# Altium footprint library ref-packages-longpad.PCBLIB: 1527 footprints (part 72 of 103)
Each footprint in its own frame and in the unit in brackets; x right, y up, seen from the top. Pads: shape width x height; smd on the part's side, far side on the other; paste and mask are expansions set on the pad; w line width, h text height; cw(c..) or ccw(c..) is an arc to the next point about the centre after c.
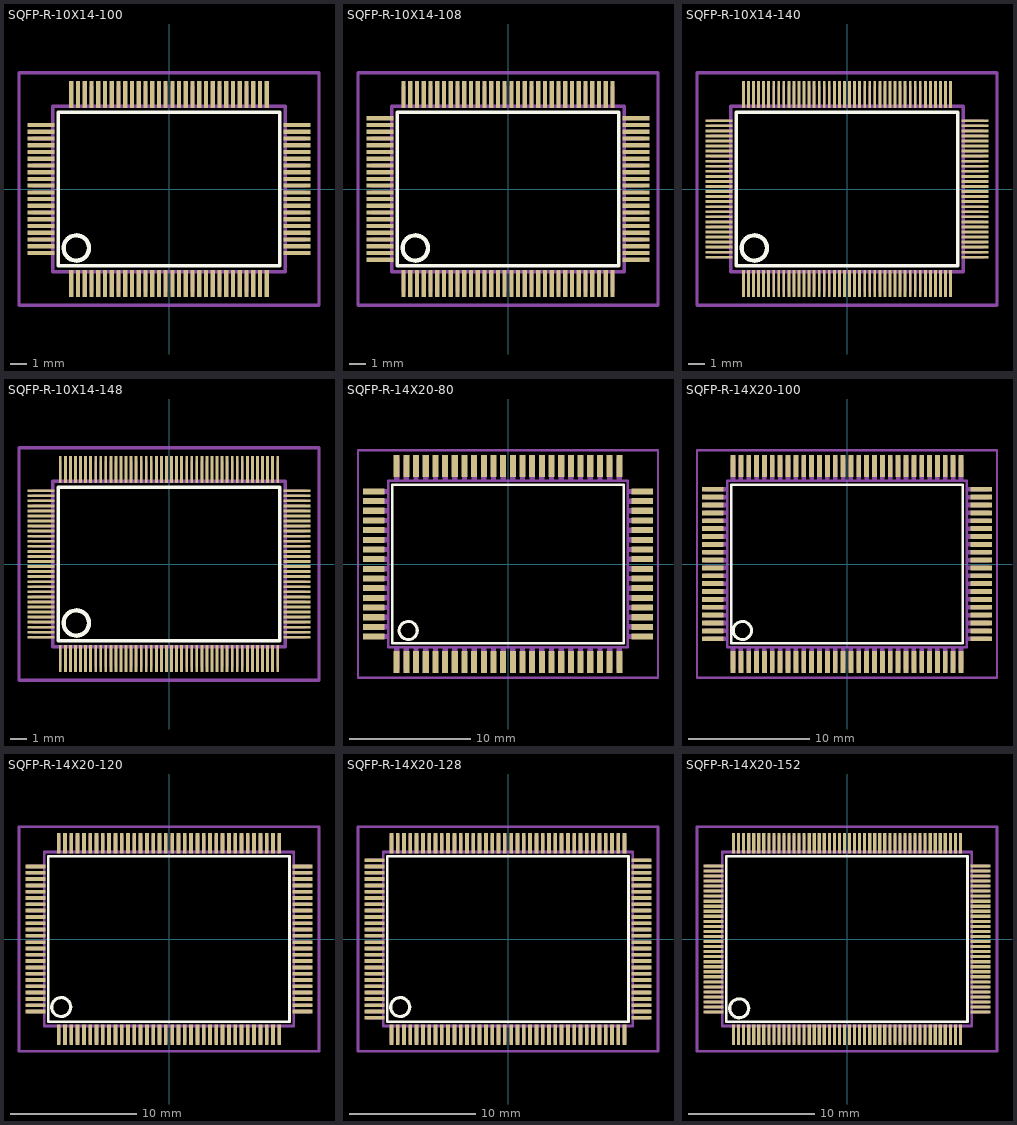
[diagram p71: the footprints below, top view; thin cyan lines are the x and y axes]

## SQFP-R-10X14-100 [mm]
pads (100):
  rect 0.25x1.6 smd: 1(-5.8,-5.6) 2(-5.4,-5.6) 3(-5,-5.6) 4(-4.6,-5.6) 5(-4.2,-5.6) 6(-3.8,-5.6) 7(-3.4,-5.6) 8(-3,-5.6) 9(-2.6,-5.6) 10(-2.2,-5.6) 11(-1.8,-5.6) 12(-1.4,-5.6) 13(-1,-5.6) 14(-0.6,-5.6) 15(-0.2,-5.6) 16(0.2,-5.6) 17(0.6,-5.6) 18(1,-5.6) 19(1.4,-5.6) 20(1.8,-5.6) 21(2.2,-5.6) 22(2.6,-5.6) 23(3,-5.6) 24(3.4,-5.6) 25(3.8,-5.6) 26(4.2,-5.6) 27(4.6,-5.6) 28(5,-5.6) 29(5.4,-5.6) 30(5.8,-5.6) 51(5.8,5.6) 52(5.4,5.6) 53(5,5.6) 54(4.6,5.6) 55(4.2,5.6) 56(3.8,5.6) 57(3.4,5.6) 58(3,5.6) 59(2.6,5.6) 60(2.2,5.6) 61(1.8,5.6) 62(1.4,5.6) 63(1,5.6) 64(0.6,5.6) 65(0.2,5.6) 66(-0.2,5.6) 67(-0.6,5.6) 68(-1,5.6) 69(-1.4,5.6) 70(-1.8,5.6) 71(-2.2,5.6) 72(-2.6,5.6) 73(-3,5.6) 74(-3.4,5.6) 75(-3.8,5.6) 76(-4.2,5.6) 77(-4.6,5.6) 78(-5,5.6) 79(-5.4,5.6) 80(-5.8,5.6)
  rect 1.6x0.25 smd: 31(7.6,-3.8) 32(7.6,-3.4) 33(7.6,-3) 34(7.6,-2.6) 35(7.6,-2.2) 36(7.6,-1.8) 37(7.6,-1.4) 38(7.6,-1) 39(7.6,-0.6) 40(7.6,-0.2) 41(7.6,0.2) 42(7.6,0.6) 43(7.6,1) 44(7.6,1.4) 45(7.6,1.8) 46(7.6,2.2) 47(7.6,2.6) 48(7.6,3) 49(7.6,3.4) 50(7.6,3.8) 81(-7.6,3.8) 82(-7.6,3.4) 83(-7.6,3) 84(-7.6,2.6) 85(-7.6,2.2) 86(-7.6,1.8) 87(-7.6,1.4) 88(-7.6,1) 89(-7.6,0.6) 90(-7.6,0.2) 91(-7.6,-0.2) 92(-7.6,-0.6) 93(-7.6,-1) 94(-7.6,-1.4) 95(-7.6,-1.8) 96(-7.6,-2.2) 97(-7.6,-2.6) 98(-7.6,-3) 99(-7.6,-3.4) 100(-7.6,-3.8)
Top Overlay:
  circle w0.254: c-5.5,-3.5 r0.75
  lines w0.203: -6.57,-4.56 6.56,-4.56 6.56,4.56 -6.57,4.56 -6.57,-4.56
Mechanical 16:
  rectangle: -5.91,-6.1 -5.69,-4.95
  rectangle: 6.95,-3.91 8.1,-3.69
  rectangle: -5.51,-6.1 -5.29,-4.95
  rectangle: -5.11,-6.1 -4.89,-4.95
  rectangle: -4.71,-6.1 -4.49,-4.95
  rectangle: -4.31,-6.1 -4.09,-4.95
  rectangle: -3.91,-6.1 -3.69,-4.95
  rectangle: -3.51,-6.1 -3.29,-4.95
  rectangle: -3.11,-6.1 -2.89,-4.95
  rectangle: -2.71,-6.1 -2.49,-4.95
  rectangle: -2.31,-6.1 -2.09,-4.95
  rectangle: -1.91,-6.1 -1.69,-4.95
  rectangle: -1.51,-6.1 -1.29,-4.95
  rectangle: -1.11,-6.1 -0.89,-4.95
  rectangle: -0.71,-6.1 -0.49,-4.95
  rectangle: -0.31,-6.1 -0.09,-4.95
  rectangle: 0.09,-6.1 0.31,-4.95
  rectangle: 0.49,-6.1 0.71,-4.95
  rectangle: 0.89,-6.1 1.11,-4.95
  rectangle: 1.29,-6.1 1.51,-4.95
  rectangle: 1.69,-6.1 1.91,-4.95
  rectangle: 2.09,-6.1 2.31,-4.95
  rectangle: 2.49,-6.1 2.71,-4.95
  rectangle: 2.89,-6.1 3.11,-4.95
  rectangle: 3.29,-6.1 3.51,-4.95
  rectangle: 3.69,-6.1 3.91,-4.95
  rectangle: 4.09,-6.1 4.31,-4.95
  rectangle: 4.49,-6.1 4.71,-4.95
  rectangle: 4.89,-6.1 5.11,-4.95
  rectangle: 5.29,-6.1 5.51,-4.95
  rectangle: 5.69,-6.1 5.91,-4.95
  rectangle: 6.95,-3.51 8.1,-3.29
  rectangle: 6.95,-3.11 8.1,-2.89
  rectangle: 6.95,-2.71 8.1,-2.49
  rectangle: 6.95,-2.31 8.1,-2.09
  rectangle: 6.95,-1.91 8.1,-1.69
  rectangle: 6.95,-1.51 8.1,-1.29
  rectangle: 6.95,-1.11 8.1,-0.89
  rectangle: 6.95,-0.71 8.1,-0.49
  rectangle: 6.95,-0.31 8.1,-0.09
  rectangle: 6.95,0.09 8.1,0.31
  rectangle: 6.95,0.49 8.1,0.71
  rectangle: 6.95,0.89 8.1,1.11
  rectangle: 6.95,1.29 8.1,1.51
  rectangle: 6.95,1.69 8.1,1.91
  rectangle: 6.95,2.09 8.1,2.31
  rectangle: 6.95,2.49 8.1,2.71
  rectangle: 6.95,2.89 8.1,3.11
  rectangle: 6.95,3.29 8.1,3.51
  rectangle: 6.95,3.69 8.1,3.91
  rectangle: 5.69,4.95 5.91,6.1
  rectangle: 5.29,4.95 5.51,6.1
  rectangle: 4.89,4.95 5.11,6.1
  rectangle: 4.49,4.95 4.71,6.1
  rectangle: 4.09,4.95 4.31,6.1
  rectangle: 3.69,4.95 3.91,6.1
  rectangle: 3.29,4.95 3.51,6.1
  rectangle: 2.89,4.95 3.11,6.1
  rectangle: 2.49,4.95 2.71,6.1
  rectangle: 2.09,4.95 2.31,6.1
  rectangle: 1.69,4.95 1.91,6.1
  rectangle: 1.29,4.95 1.51,6.1
  rectangle: 0.89,4.95 1.11,6.1
  rectangle: 0.49,4.95 0.71,6.1
  rectangle: 0.09,4.95 0.31,6.1
  rectangle: -0.31,4.95 -0.09,6.1
  rectangle: -0.71,4.95 -0.49,6.1
  rectangle: -1.11,4.95 -0.89,6.1
  rectangle: -1.51,4.95 -1.29,6.1
  rectangle: -1.91,4.95 -1.69,6.1
  rectangle: -2.31,4.95 -2.09,6.1
  rectangle: -2.71,4.95 -2.49,6.1
  rectangle: -3.11,4.95 -2.89,6.1
  rectangle: -3.51,4.95 -3.29,6.1
  rectangle: -3.91,4.95 -3.69,6.1
  rectangle: -4.31,4.95 -4.09,6.1
  rectangle: -4.71,4.95 -4.49,6.1
  rectangle: -5.11,4.95 -4.89,6.1
  rectangle: -5.51,4.95 -5.29,6.1
  rectangle: -5.91,4.95 -5.69,6.1
  rectangle: -8.1,3.69 -6.95,3.91
  rectangle: -8.1,3.29 -6.95,3.51
  rectangle: -8.1,2.89 -6.95,3.11
  rectangle: -8.1,2.49 -6.95,2.71
  rectangle: -8.1,2.09 -6.95,2.31
  rectangle: -8.1,1.69 -6.95,1.91
  rectangle: -8.1,1.29 -6.95,1.51
  rectangle: -8.1,0.89 -6.95,1.11
  rectangle: -8.1,0.49 -6.95,0.71
  rectangle: -8.1,0.09 -6.95,0.31
  rectangle: -8.1,-0.31 -6.95,-0.09
  rectangle: -8.1,-0.71 -6.95,-0.49
  rectangle: -8.1,-1.11 -6.95,-0.89
  rectangle: -8.1,-1.51 -6.95,-1.29
  rectangle: -8.1,-1.91 -6.95,-1.69
  rectangle: -8.1,-2.31 -6.95,-2.09
  rectangle: -8.1,-2.71 -6.95,-2.49
  rectangle: -8.1,-3.11 -6.95,-2.89
  rectangle: -8.1,-3.51 -6.95,-3.29
  rectangle: -8.1,-3.91 -6.95,-3.69
  lines w0.203: -6.9,-4.9 6.9,-4.9 6.9,4.9 -6.9,4.9 -6.9,-4.9
Mechanical 27:
  lines w0.2: -8.9,-6.9 -8.9,6.9 8.9,6.9 8.9,-6.9 -8.9,-6.9

## SQFP-R-10X14-108 [mm]
pads (108):
  rect 0.25x1.6 smd: 1(-6.2,-5.6) 2(-5.8,-5.6) 3(-5.4,-5.6) 4(-5,-5.6) 5(-4.6,-5.6) 6(-4.2,-5.6) 7(-3.8,-5.6) 8(-3.4,-5.6) 9(-3,-5.6) 10(-2.6,-5.6) 11(-2.2,-5.6) 12(-1.8,-5.6) 13(-1.4,-5.6) 14(-1,-5.6) 15(-0.6,-5.6) 16(-0.2,-5.6) 17(0.2,-5.6) 18(0.6,-5.6) 19(1,-5.6) 20(1.4,-5.6) 21(1.8,-5.6) 22(2.2,-5.6) 23(2.6,-5.6) 24(3,-5.6) 25(3.4,-5.6) 26(3.8,-5.6) 27(4.2,-5.6) 28(4.6,-5.6) 29(5,-5.6) 30(5.4,-5.6) 31(5.8,-5.6) 32(6.2,-5.6) 55(6.2,5.6) 56(5.8,5.6) 57(5.4,5.6) 58(5,5.6) 59(4.6,5.6) 60(4.2,5.6) 61(3.8,5.6) 62(3.4,5.6) 63(3,5.6) 64(2.6,5.6) 65(2.2,5.6) 66(1.8,5.6) 67(1.4,5.6) 68(1,5.6) 69(0.6,5.6) 70(0.2,5.6) 71(-0.2,5.6) 72(-0.6,5.6) 73(-1,5.6) 74(-1.4,5.6) 75(-1.8,5.6) 76(-2.2,5.6) 77(-2.6,5.6) 78(-3,5.6) 79(-3.4,5.6) 80(-3.8,5.6) 81(-4.2,5.6) 82(-4.6,5.6) 83(-5,5.6) 84(-5.4,5.6) 85(-5.8,5.6) 86(-6.2,5.6)
  rect 1.6x0.25 smd: 33(7.6,-4.2) 34(7.6,-3.8) 35(7.6,-3.4) 36(7.6,-3) 37(7.6,-2.6) 38(7.6,-2.2) 39(7.6,-1.8) 40(7.6,-1.4) 41(7.6,-1) 42(7.6,-0.6) 43(7.6,-0.2) 44(7.6,0.2) 45(7.6,0.6) 46(7.6,1) 47(7.6,1.4) 48(7.6,1.8) 49(7.6,2.2) 50(7.6,2.6) 51(7.6,3) 52(7.6,3.4) 53(7.6,3.8) 54(7.6,4.2) 87(-7.6,4.2) 88(-7.6,3.8) 89(-7.6,3.4) 90(-7.6,3) 91(-7.6,2.6) 92(-7.6,2.2) 93(-7.6,1.8) 94(-7.6,1.4) 95(-7.6,1) 96(-7.6,0.6) 97(-7.6,0.2) 98(-7.6,-0.2) 99(-7.6,-0.6) 100(-7.6,-1) 101(-7.6,-1.4) 102(-7.6,-1.8) 103(-7.6,-2.2) 104(-7.6,-2.6) 105(-7.6,-3) 106(-7.6,-3.4) 107(-7.6,-3.8) 108(-7.6,-4.2)
Top Overlay:
  circle w0.254: c-5.5,-3.5 r0.75
  lines w0.203: -6.57,-4.56 6.56,-4.56 6.56,4.56 -6.57,4.56 -6.57,-4.56
Mechanical 16:
  rectangle: -6.31,-6.1 -6.09,-4.95
  rectangle: 6.95,-4.31 8.1,-4.09
  rectangle: -5.91,-6.1 -5.69,-4.95
  rectangle: -5.51,-6.1 -5.29,-4.95
  rectangle: -5.11,-6.1 -4.89,-4.95
  rectangle: -4.71,-6.1 -4.49,-4.95
  rectangle: -4.31,-6.1 -4.09,-4.95
  rectangle: -3.91,-6.1 -3.69,-4.95
  rectangle: -3.51,-6.1 -3.29,-4.95
  rectangle: -3.11,-6.1 -2.89,-4.95
  rectangle: -2.71,-6.1 -2.49,-4.95
  rectangle: -2.31,-6.1 -2.09,-4.95
  rectangle: -1.91,-6.1 -1.69,-4.95
  rectangle: -1.51,-6.1 -1.29,-4.95
  rectangle: -1.11,-6.1 -0.89,-4.95
  rectangle: -0.71,-6.1 -0.49,-4.95
  rectangle: -0.31,-6.1 -0.09,-4.95
  rectangle: 0.09,-6.1 0.31,-4.95
  rectangle: 0.49,-6.1 0.71,-4.95
  rectangle: 0.89,-6.1 1.11,-4.95
  rectangle: 1.29,-6.1 1.51,-4.95
  rectangle: 1.69,-6.1 1.91,-4.95
  rectangle: 2.09,-6.1 2.31,-4.95
  rectangle: 2.49,-6.1 2.71,-4.95
  rectangle: 2.89,-6.1 3.11,-4.95
  rectangle: 3.29,-6.1 3.51,-4.95
  rectangle: 3.69,-6.1 3.91,-4.95
  rectangle: 4.09,-6.1 4.31,-4.95
  rectangle: 4.49,-6.1 4.71,-4.95
  rectangle: 4.89,-6.1 5.11,-4.95
  rectangle: 5.29,-6.1 5.51,-4.95
  rectangle: 5.69,-6.1 5.91,-4.95
  rectangle: 6.09,-6.1 6.31,-4.95
  rectangle: 6.95,-3.91 8.1,-3.69
  rectangle: 6.95,-3.51 8.1,-3.29
  rectangle: 6.95,-3.11 8.1,-2.89
  rectangle: 6.95,-2.71 8.1,-2.49
  rectangle: 6.95,-2.31 8.1,-2.09
  rectangle: 6.95,-1.91 8.1,-1.69
  rectangle: 6.95,-1.51 8.1,-1.29
  rectangle: 6.95,-1.11 8.1,-0.89
  rectangle: 6.95,-0.71 8.1,-0.49
  rectangle: 6.95,-0.31 8.1,-0.09
  rectangle: 6.95,0.09 8.1,0.31
  rectangle: 6.95,0.49 8.1,0.71
  rectangle: 6.95,0.89 8.1,1.11
  rectangle: 6.95,1.29 8.1,1.51
  rectangle: 6.95,1.69 8.1,1.91
  rectangle: 6.95,2.09 8.1,2.31
  rectangle: 6.95,2.49 8.1,2.71
  rectangle: 6.95,2.89 8.1,3.11
  rectangle: 6.95,3.29 8.1,3.51
  rectangle: 6.95,3.69 8.1,3.91
  rectangle: 6.95,4.09 8.1,4.31
  rectangle: 6.09,4.95 6.31,6.1
  rectangle: 5.69,4.95 5.91,6.1
  rectangle: 5.29,4.95 5.51,6.1
  rectangle: 4.89,4.95 5.11,6.1
  rectangle: 4.49,4.95 4.71,6.1
  rectangle: 4.09,4.95 4.31,6.1
  rectangle: 3.69,4.95 3.91,6.1
  rectangle: 3.29,4.95 3.51,6.1
  rectangle: 2.89,4.95 3.11,6.1
  rectangle: 2.49,4.95 2.71,6.1
  rectangle: 2.09,4.95 2.31,6.1
  rectangle: 1.69,4.95 1.91,6.1
  rectangle: 1.29,4.95 1.51,6.1
  rectangle: 0.89,4.95 1.11,6.1
  rectangle: 0.49,4.95 0.71,6.1
  rectangle: 0.09,4.95 0.31,6.1
  rectangle: -0.31,4.95 -0.09,6.1
  rectangle: -0.71,4.95 -0.49,6.1
  rectangle: -1.11,4.95 -0.89,6.1
  rectangle: -1.51,4.95 -1.29,6.1
  rectangle: -1.91,4.95 -1.69,6.1
  rectangle: -2.31,4.95 -2.09,6.1
  rectangle: -2.71,4.95 -2.49,6.1
  rectangle: -3.11,4.95 -2.89,6.1
  rectangle: -3.51,4.95 -3.29,6.1
  rectangle: -3.91,4.95 -3.69,6.1
  rectangle: -4.31,4.95 -4.09,6.1
  rectangle: -4.71,4.95 -4.49,6.1
  rectangle: -5.11,4.95 -4.89,6.1
  rectangle: -5.51,4.95 -5.29,6.1
  rectangle: -5.91,4.95 -5.69,6.1
  rectangle: -6.31,4.95 -6.09,6.1
  rectangle: -8.1,4.09 -6.95,4.31
  rectangle: -8.1,3.69 -6.95,3.91
  rectangle: -8.1,3.29 -6.95,3.51
  rectangle: -8.1,2.89 -6.95,3.11
  rectangle: -8.1,2.49 -6.95,2.71
  rectangle: -8.1,2.09 -6.95,2.31
  rectangle: -8.1,1.69 -6.95,1.91
  rectangle: -8.1,1.29 -6.95,1.51
  rectangle: -8.1,0.89 -6.95,1.11
  rectangle: -8.1,0.49 -6.95,0.71
  rectangle: -8.1,0.09 -6.95,0.31
  rectangle: -8.1,-0.31 -6.95,-0.09
  rectangle: -8.1,-0.71 -6.95,-0.49
  rectangle: -8.1,-1.11 -6.95,-0.89
  rectangle: -8.1,-1.51 -6.95,-1.29
  rectangle: -8.1,-1.91 -6.95,-1.69
  rectangle: -8.1,-2.31 -6.95,-2.09
  rectangle: -8.1,-2.71 -6.95,-2.49
  rectangle: -8.1,-3.11 -6.95,-2.89
  rectangle: -8.1,-3.51 -6.95,-3.29
  rectangle: -8.1,-3.91 -6.95,-3.69
  rectangle: -8.1,-4.31 -6.95,-4.09
  lines w0.203: -6.9,-4.9 6.9,-4.9 6.9,4.9 -6.9,4.9 -6.9,-4.9
Mechanical 27:
  lines w0.2: -8.9,-6.9 -8.9,6.9 8.9,6.9 8.9,-6.9 -8.9,-6.9

## SQFP-R-10X14-140 [mm]
pads (140):
  rect 0.17x1.6 smd: 1(-6.15,-5.6) 2(-5.85,-5.6) 3(-5.55,-5.6) 4(-5.25,-5.6) 5(-4.95,-5.6) 6(-4.65,-5.6) 7(-4.35,-5.6) 8(-4.05,-5.6) 9(-3.75,-5.6) 10(-3.45,-5.6) 11(-3.15,-5.6) 12(-2.85,-5.6) 13(-2.55,-5.6) 14(-2.25,-5.6) 15(-1.95,-5.6) 16(-1.65,-5.6) 17(-1.35,-5.6) 18(-1.05,-5.6) 19(-0.75,-5.6) 20(-0.45,-5.6) 21(-0.15,-5.6) 22(0.15,-5.6) 23(0.45,-5.6) 24(0.75,-5.6) 25(1.05,-5.6) 26(1.35,-5.6) 27(1.65,-5.6) 28(1.95,-5.6) 29(2.25,-5.6) 30(2.55,-5.6) 31(2.85,-5.6) 32(3.15,-5.6) 33(3.45,-5.6) 34(3.75,-5.6) 35(4.05,-5.6) 36(4.35,-5.6) 37(4.65,-5.6) 38(4.95,-5.6) 39(5.25,-5.6) 40(5.55,-5.6) 41(5.85,-5.6) 42(6.15,-5.6) 71(6.15,5.6) 72(5.85,5.6) 73(5.55,5.6) 74(5.25,5.6) 75(4.95,5.6) 76(4.65,5.6) 77(4.35,5.6) 78(4.05,5.6) 79(3.75,5.6) 80(3.45,5.6) 81(3.15,5.6) 82(2.85,5.6) 83(2.55,5.6) 84(2.25,5.6) 85(1.95,5.6) 86(1.65,5.6) 87(1.35,5.6) 88(1.05,5.6) 89(0.75,5.6) 90(0.45,5.6) 91(0.15,5.6) 92(-0.15,5.6) 93(-0.45,5.6) 94(-0.75,5.6) 95(-1.05,5.6) 96(-1.35,5.6) 97(-1.65,5.6) 98(-1.95,5.6) 99(-2.25,5.6) 100(-2.55,5.6) 101(-2.85,5.6) 102(-3.15,5.6) 103(-3.45,5.6) 104(-3.75,5.6) 105(-4.05,5.6) 106(-4.35,5.6) 107(-4.65,5.6) 108(-4.95,5.6) 109(-5.25,5.6) 110(-5.55,5.6) 111(-5.85,5.6) 112(-6.15,5.6)
  rect 1.6x0.17 smd: 43(7.6,-4.05) 44(7.6,-3.75) 45(7.6,-3.45) 46(7.6,-3.15) 47(7.6,-2.85) 48(7.6,-2.55) 49(7.6,-2.25) 50(7.6,-1.95) 51(7.6,-1.65) 52(7.6,-1.35) 53(7.6,-1.05) 54(7.6,-0.75) 55(7.6,-0.45) 56(7.6,-0.15) 57(7.6,0.15) 58(7.6,0.45) 59(7.6,0.75) 60(7.6,1.05) 61(7.6,1.35) 62(7.6,1.65) 63(7.6,1.95) 64(7.6,2.25) 65(7.6,2.55) 66(7.6,2.85) 67(7.6,3.15) 68(7.6,3.45) 69(7.6,3.75) 70(7.6,4.05) 113(-7.6,4.05) 114(-7.6,3.75) 115(-7.6,3.45) 116(-7.6,3.15) 117(-7.6,2.85) 118(-7.6,2.55) 119(-7.6,2.25) 120(-7.6,1.95) 121(-7.6,1.65) 122(-7.6,1.35) 123(-7.6,1.05) 124(-7.6,0.75) 125(-7.6,0.45) 126(-7.6,0.15) 127(-7.6,-0.15) 128(-7.6,-0.45) 129(-7.6,-0.75) 130(-7.6,-1.05) 131(-7.6,-1.35) 132(-7.6,-1.65) 133(-7.6,-1.95) 134(-7.6,-2.25) 135(-7.6,-2.55) 136(-7.6,-2.85) 137(-7.6,-3.15) 138(-7.6,-3.45) 139(-7.6,-3.75) 140(-7.6,-4.05)
Top Overlay:
  circle w0.254: c-5.5,-3.5 r0.75
  lines w0.203: -6.57,-4.56 6.56,-4.56 6.56,4.56 -6.57,4.56 -6.57,-4.56
Mechanical 16:
  rectangle: -6.22,-6.1 -6.08,-4.95
  rectangle: 6.95,-4.12 8.1,-3.98
  rectangle: -5.92,-6.1 -5.78,-4.95
  rectangle: -5.62,-6.1 -5.48,-4.95
  rectangle: -5.32,-6.1 -5.18,-4.95
  rectangle: -5.02,-6.1 -4.88,-4.95
  rectangle: -4.72,-6.1 -4.58,-4.95
  rectangle: -4.42,-6.1 -4.28,-4.95
  rectangle: -4.12,-6.1 -3.98,-4.95
  rectangle: -3.82,-6.1 -3.68,-4.95
  rectangle: -3.52,-6.1 -3.38,-4.95
  rectangle: -3.22,-6.1 -3.08,-4.95
  rectangle: -2.92,-6.1 -2.78,-4.95
  rectangle: -2.62,-6.1 -2.48,-4.95
  rectangle: -2.32,-6.1 -2.18,-4.95
  rectangle: -2.02,-6.1 -1.88,-4.95
  rectangle: -1.72,-6.1 -1.58,-4.95
  rectangle: -1.42,-6.1 -1.28,-4.95
  rectangle: -1.12,-6.1 -0.98,-4.95
  rectangle: -0.82,-6.1 -0.68,-4.95
  rectangle: -0.52,-6.1 -0.38,-4.95
  rectangle: -0.22,-6.1 -0.08,-4.95
  rectangle: 0.08,-6.1 0.22,-4.95
  rectangle: 0.38,-6.1 0.52,-4.95
  rectangle: 0.68,-6.1 0.82,-4.95
  rectangle: 0.98,-6.1 1.12,-4.95
  rectangle: 1.28,-6.1 1.42,-4.95
  rectangle: 1.58,-6.1 1.72,-4.95
  rectangle: 1.88,-6.1 2.02,-4.95
  rectangle: 2.18,-6.1 2.32,-4.95
  rectangle: 2.48,-6.1 2.62,-4.95
  rectangle: 2.78,-6.1 2.92,-4.95
  rectangle: 3.08,-6.1 3.22,-4.95
  rectangle: 3.38,-6.1 3.52,-4.95
  rectangle: 3.68,-6.1 3.82,-4.95
  rectangle: 3.98,-6.1 4.12,-4.95
  rectangle: 4.28,-6.1 4.42,-4.95
  rectangle: 4.58,-6.1 4.72,-4.95
  rectangle: 4.88,-6.1 5.02,-4.95
  rectangle: 5.18,-6.1 5.32,-4.95
  rectangle: 5.48,-6.1 5.62,-4.95
  rectangle: 5.78,-6.1 5.92,-4.95
  rectangle: 6.08,-6.1 6.22,-4.95
  rectangle: 6.95,-3.82 8.1,-3.68
  rectangle: 6.95,-3.52 8.1,-3.38
  rectangle: 6.95,-3.22 8.1,-3.08
  rectangle: 6.95,-2.92 8.1,-2.78
  rectangle: 6.95,-2.62 8.1,-2.48
  rectangle: 6.95,-2.32 8.1,-2.18
  rectangle: 6.95,-2.02 8.1,-1.88
  rectangle: 6.95,-1.72 8.1,-1.58
  rectangle: 6.95,-1.42 8.1,-1.28
  rectangle: 6.95,-1.12 8.1,-0.98
  rectangle: 6.95,-0.82 8.1,-0.68
  rectangle: 6.95,-0.52 8.1,-0.38
  rectangle: 6.95,-0.22 8.1,-0.08
  rectangle: 6.95,0.08 8.1,0.22
  rectangle: 6.95,0.38 8.1,0.52
  rectangle: 6.95,0.68 8.1,0.82
  rectangle: 6.95,0.98 8.1,1.12
  rectangle: 6.95,1.28 8.1,1.42
  rectangle: 6.95,1.58 8.1,1.72
  rectangle: 6.95,1.88 8.1,2.02
  rectangle: 6.95,2.18 8.1,2.32
  rectangle: 6.95,2.48 8.1,2.62
  rectangle: 6.95,2.78 8.1,2.92
  rectangle: 6.95,3.08 8.1,3.22
  rectangle: 6.95,3.38 8.1,3.52
  rectangle: 6.95,3.68 8.1,3.82
  rectangle: 6.95,3.98 8.1,4.12
  rectangle: 6.08,4.95 6.22,6.1
  rectangle: 5.78,4.95 5.92,6.1
  rectangle: 5.48,4.95 5.62,6.1
  rectangle: 5.18,4.95 5.32,6.1
  rectangle: 4.88,4.95 5.02,6.1
  rectangle: 4.58,4.95 4.72,6.1
  rectangle: 4.28,4.95 4.42,6.1
  rectangle: 3.98,4.95 4.12,6.1
  rectangle: 3.68,4.95 3.82,6.1
  rectangle: 3.38,4.95 3.52,6.1
  rectangle: 3.08,4.95 3.22,6.1
  rectangle: 2.78,4.95 2.92,6.1
  rectangle: 2.48,4.95 2.62,6.1
  rectangle: 2.18,4.95 2.32,6.1
  rectangle: 1.88,4.95 2.02,6.1
  rectangle: 1.58,4.95 1.72,6.1
  rectangle: 1.28,4.95 1.42,6.1
  rectangle: 0.98,4.95 1.12,6.1
  rectangle: 0.68,4.95 0.82,6.1
  rectangle: 0.38,4.95 0.52,6.1
  rectangle: 0.08,4.95 0.22,6.1
  rectangle: -0.22,4.95 -0.08,6.1
  rectangle: -0.52,4.95 -0.38,6.1
  rectangle: -0.82,4.95 -0.68,6.1
  rectangle: -1.12,4.95 -0.98,6.1
  rectangle: -1.42,4.95 -1.28,6.1
  rectangle: -1.72,4.95 -1.58,6.1
  rectangle: -2.02,4.95 -1.88,6.1
  rectangle: -2.32,4.95 -2.18,6.1
  rectangle: -2.62,4.95 -2.48,6.1
  rectangle: -2.92,4.95 -2.78,6.1
  rectangle: -3.22,4.95 -3.08,6.1
  rectangle: -3.52,4.95 -3.38,6.1
  rectangle: -3.82,4.95 -3.68,6.1
  rectangle: -4.12,4.95 -3.98,6.1
  rectangle: -4.42,4.95 -4.28,6.1
  rectangle: -4.72,4.95 -4.58,6.1
  rectangle: -5.02,4.95 -4.88,6.1
  rectangle: -5.32,4.95 -5.18,6.1
  rectangle: -5.62,4.95 -5.48,6.1
  rectangle: -5.92,4.95 -5.78,6.1
  rectangle: -6.22,4.95 -6.08,6.1
  rectangle: -8.1,3.98 -6.95,4.12
  rectangle: -8.1,3.68 -6.95,3.82
  rectangle: -8.1,3.38 -6.95,3.52
  rectangle: -8.1,3.08 -6.95,3.22
  rectangle: -8.1,2.78 -6.95,2.92
  rectangle: -8.1,2.48 -6.95,2.62
  rectangle: -8.1,2.18 -6.95,2.32
  rectangle: -8.1,1.88 -6.95,2.02
  rectangle: -8.1,1.58 -6.95,1.72
  rectangle: -8.1,1.28 -6.95,1.42
  rectangle: -8.1,0.98 -6.95,1.12
  rectangle: -8.1,0.68 -6.95,0.82
  rectangle: -8.1,0.38 -6.95,0.52
  rectangle: -8.1,0.08 -6.95,0.22
  rectangle: -8.1,-0.22 -6.95,-0.08
  rectangle: -8.1,-0.52 -6.95,-0.38
  rectangle: -8.1,-0.82 -6.95,-0.68
  rectangle: -8.1,-1.12 -6.95,-0.98
  rectangle: -8.1,-1.42 -6.95,-1.28
  rectangle: -8.1,-1.72 -6.95,-1.58
  rectangle: -8.1,-2.02 -6.95,-1.88
  rectangle: -8.1,-2.32 -6.95,-2.18
  rectangle: -8.1,-2.62 -6.95,-2.48
  rectangle: -8.1,-2.92 -6.95,-2.78
  rectangle: -8.1,-3.22 -6.95,-3.08
  rectangle: -8.1,-3.52 -6.95,-3.38
  rectangle: -8.1,-3.82 -6.95,-3.68
  rectangle: -8.1,-4.12 -6.95,-3.98
  lines w0.203: -6.9,-4.9 6.9,-4.9 6.9,4.9 -6.9,4.9 -6.9,-4.9
Mechanical 27:
  lines w0.2: -8.9,-6.9 -8.9,6.9 8.9,6.9 8.9,-6.9 -8.9,-6.9

## SQFP-R-10X14-148 [mm]
pads (148):
  rect 0.17x1.6 smd: 1(-6.45,-5.6) 2(-6.15,-5.6) 3(-5.85,-5.6) 4(-5.55,-5.6) 5(-5.25,-5.6) 6(-4.95,-5.6) 7(-4.65,-5.6) 8(-4.35,-5.6) 9(-4.05,-5.6) 10(-3.75,-5.6) 11(-3.45,-5.6) 12(-3.15,-5.6) 13(-2.85,-5.6) 14(-2.55,-5.6) 15(-2.25,-5.6) 16(-1.95,-5.6) 17(-1.65,-5.6) 18(-1.35,-5.6) 19(-1.05,-5.6) 20(-0.75,-5.6) 21(-0.45,-5.6) 22(-0.15,-5.6) 23(0.15,-5.6) 24(0.45,-5.6) 25(0.75,-5.6) 26(1.05,-5.6) 27(1.35,-5.6) 28(1.65,-5.6) 29(1.95,-5.6) 30(2.25,-5.6) 31(2.55,-5.6) 32(2.85,-5.6) 33(3.15,-5.6) 34(3.45,-5.6) 35(3.75,-5.6) 36(4.05,-5.6) 37(4.35,-5.6) 38(4.65,-5.6) 39(4.95,-5.6) 40(5.25,-5.6) 41(5.55,-5.6) 42(5.85,-5.6) 43(6.15,-5.6) 44(6.45,-5.6) 75(6.45,5.6) 76(6.15,5.6) 77(5.85,5.6) 78(5.55,5.6) 79(5.25,5.6) 80(4.95,5.6) 81(4.65,5.6) 82(4.35,5.6) 83(4.05,5.6) 84(3.75,5.6) 85(3.45,5.6) 86(3.15,5.6) 87(2.85,5.6) 88(2.55,5.6) 89(2.25,5.6) 90(1.95,5.6) 91(1.65,5.6) 92(1.35,5.6) 93(1.05,5.6) 94(0.75,5.6) 95(0.45,5.6) 96(0.15,5.6) 97(-0.15,5.6) 98(-0.45,5.6) 99(-0.75,5.6) 100(-1.05,5.6) 101(-1.35,5.6) 102(-1.65,5.6) 103(-1.95,5.6) 104(-2.25,5.6) 105(-2.55,5.6) 106(-2.85,5.6) 107(-3.15,5.6) 108(-3.45,5.6) 109(-3.75,5.6) 110(-4.05,5.6) 111(-4.35,5.6) 112(-4.65,5.6) 113(-4.95,5.6) 114(-5.25,5.6) 115(-5.55,5.6) 116(-5.85,5.6) 117(-6.15,5.6) 118(-6.45,5.6)
  rect 1.6x0.17 smd: 45(7.6,-4.35) 46(7.6,-4.05) 47(7.6,-3.75) 48(7.6,-3.45) 49(7.6,-3.15) 50(7.6,-2.85) 51(7.6,-2.55) 52(7.6,-2.25) 53(7.6,-1.95) 54(7.6,-1.65) 55(7.6,-1.35) 56(7.6,-1.05) 57(7.6,-0.75) 58(7.6,-0.45) 59(7.6,-0.15) 60(7.6,0.15) 61(7.6,0.45) 62(7.6,0.75) 63(7.6,1.05) 64(7.6,1.35) 65(7.6,1.65) 66(7.6,1.95) 67(7.6,2.25) 68(7.6,2.55) 69(7.6,2.85) 70(7.6,3.15) 71(7.6,3.45) 72(7.6,3.75) 73(7.6,4.05) 74(7.6,4.35) 119(-7.6,4.35) 120(-7.6,4.05) 121(-7.6,3.75) 122(-7.6,3.45) 123(-7.6,3.15) 124(-7.6,2.85) 125(-7.6,2.55) 126(-7.6,2.25) 127(-7.6,1.95) 128(-7.6,1.65) 129(-7.6,1.35) 130(-7.6,1.05) 131(-7.6,0.75) 132(-7.6,0.45) 133(-7.6,0.15) 134(-7.6,-0.15) 135(-7.6,-0.45) 136(-7.6,-0.75) 137(-7.6,-1.05) 138(-7.6,-1.35) 139(-7.6,-1.65) 140(-7.6,-1.95) 141(-7.6,-2.25) 142(-7.6,-2.55) 143(-7.6,-2.85) 144(-7.6,-3.15) 145(-7.6,-3.45) 146(-7.6,-3.75) 147(-7.6,-4.05) 148(-7.6,-4.35)
Top Overlay:
  circle w0.254: c-5.5,-3.5 r0.75
  lines w0.203: -6.57,-4.56 6.56,-4.56 6.56,4.56 -6.57,4.56 -6.57,-4.56
Mechanical 16:
  drawing of 152 lines, arcs and shapes, not listed
Mechanical 27:
  lines w0.2: -8.9,-6.9 -8.9,6.9 8.9,6.9 8.9,-6.9 -8.9,-6.9

## SQFP-R-14X20-80 [mm]
pads (80):
  rect 0.5x1.8 smd: 1(-9.2,-8.1) 2(-8.4,-8.1) 3(-7.6,-8.1) 4(-6.8,-8.1) 5(-6,-8.1) 6(-5.2,-8.1) 7(-4.4,-8.1) 8(-3.6,-8.1) 9(-2.8,-8.1) 10(-2,-8.1) 11(-1.2,-8.1) 12(-0.4,-8.1) 13(0.4,-8.1) 14(1.2,-8.1) 15(2,-8.1) 16(2.8,-8.1) 17(3.6,-8.1) 18(4.4,-8.1) 19(5.2,-8.1) 20(6,-8.1) 21(6.8,-8.1) 22(7.6,-8.1) 23(8.4,-8.1) 24(9.2,-8.1) 41(9.2,8.1) 42(8.4,8.1) 43(7.6,8.1) 44(6.8,8.1) 45(6,8.1) 46(5.2,8.1) 47(4.4,8.1) 48(3.6,8.1) 49(2.8,8.1) 50(2,8.1) 51(1.2,8.1) 52(0.4,8.1) 53(-0.4,8.1) 54(-1.2,8.1) 55(-2,8.1) 56(-2.8,8.1) 57(-3.6,8.1) 58(-4.4,8.1) 59(-5.2,8.1) 60(-6,8.1) 61(-6.8,8.1) 62(-7.6,8.1) 63(-8.4,8.1) 64(-9.2,8.1)
  rect 1.8x0.5 smd: 25(11.1,-6) 26(11.1,-5.2) 27(11.1,-4.4) 28(11.1,-3.6) 29(11.1,-2.8) 30(11.1,-2) 31(11.1,-1.2) 32(11.1,-0.4) 33(11.1,0.4) 34(11.1,1.2) 35(11.1,2) 36(11.1,2.8) 37(11.1,3.6) 38(11.1,4.4) 39(11.1,5.2) 40(11.1,6) 65(-11.1,6) 66(-11.1,5.2) 67(-11.1,4.4) 68(-11.1,3.6) 69(-11.1,2.8) 70(-11.1,2) 71(-11.1,1.2) 72(-11.1,0.4) 73(-11.1,-0.4) 74(-11.1,-1.2) 75(-11.1,-2) 76(-11.1,-2.8) 77(-11.1,-3.6) 78(-11.1,-4.4) 79(-11.1,-5.2) 80(-11.1,-6)
Top Overlay:
  circle w0.254: c-8.25,-5.5 r0.75
  lines w0.203: -9.57,-6.56 9.56,-6.56 9.56,6.56 -9.57,6.56 -9.57,-6.56
Mechanical 16:
  rectangle: -9.42,-8.72 -8.98,-6.95
  rectangle: 9.95,-6.22 11.72,-5.78
  rectangle: -8.62,-8.72 -8.18,-6.95
  rectangle: -7.82,-8.72 -7.38,-6.95
  rectangle: -7.02,-8.72 -6.58,-6.95
  rectangle: -6.22,-8.72 -5.78,-6.95
  rectangle: -5.42,-8.72 -4.98,-6.95
  rectangle: -4.62,-8.72 -4.18,-6.95
  rectangle: -3.82,-8.72 -3.38,-6.95
  rectangle: -3.02,-8.72 -2.58,-6.95
  rectangle: -2.22,-8.72 -1.78,-6.95
  rectangle: -1.42,-8.72 -0.98,-6.95
  rectangle: -0.62,-8.72 -0.18,-6.95
  rectangle: 0.18,-8.72 0.62,-6.95
  rectangle: 0.98,-8.72 1.42,-6.95
  rectangle: 1.78,-8.72 2.22,-6.95
  rectangle: 2.58,-8.72 3.02,-6.95
  rectangle: 3.38,-8.72 3.82,-6.95
  rectangle: 4.18,-8.72 4.62,-6.95
  rectangle: 4.98,-8.72 5.42,-6.95
  rectangle: 5.78,-8.72 6.22,-6.95
  rectangle: 6.58,-8.72 7.02,-6.95
  rectangle: 7.38,-8.72 7.82,-6.95
  rectangle: 8.18,-8.72 8.62,-6.95
  rectangle: 8.98,-8.72 9.42,-6.95
  rectangle: 9.95,-5.42 11.72,-4.98
  rectangle: 9.95,-4.62 11.72,-4.18
  rectangle: 9.95,-3.82 11.72,-3.38
  rectangle: 9.95,-3.02 11.72,-2.58
  rectangle: 9.95,-2.22 11.72,-1.78
  rectangle: 9.95,-1.42 11.72,-0.98
  rectangle: 9.95,-0.62 11.72,-0.18
  rectangle: 9.95,0.18 11.72,0.62
  rectangle: 9.95,0.98 11.72,1.42
  rectangle: 9.95,1.78 11.72,2.22
  rectangle: 9.95,2.58 11.72,3.02
  rectangle: 9.95,3.38 11.72,3.82
  rectangle: 9.95,4.18 11.72,4.62
  rectangle: 9.95,4.98 11.72,5.42
  rectangle: 9.95,5.78 11.72,6.22
  rectangle: 8.98,6.95 9.42,8.72
  rectangle: 8.18,6.95 8.62,8.72
  rectangle: 7.38,6.95 7.82,8.72
  rectangle: 6.58,6.95 7.02,8.72